# Altium footprint library 二极管封装库.PcbLib: 222 footprints (part 10 of 14)
Each footprint in its own frame and in the unit in brackets; x right, y up, seen from the top. Pads: shape width x height; smd on the part's side, far side on the other; paste and mask are expansions set on the pad; w line width, h text height; cw(c..) or ccw(c..) is an arc to the next point about the centre after c.
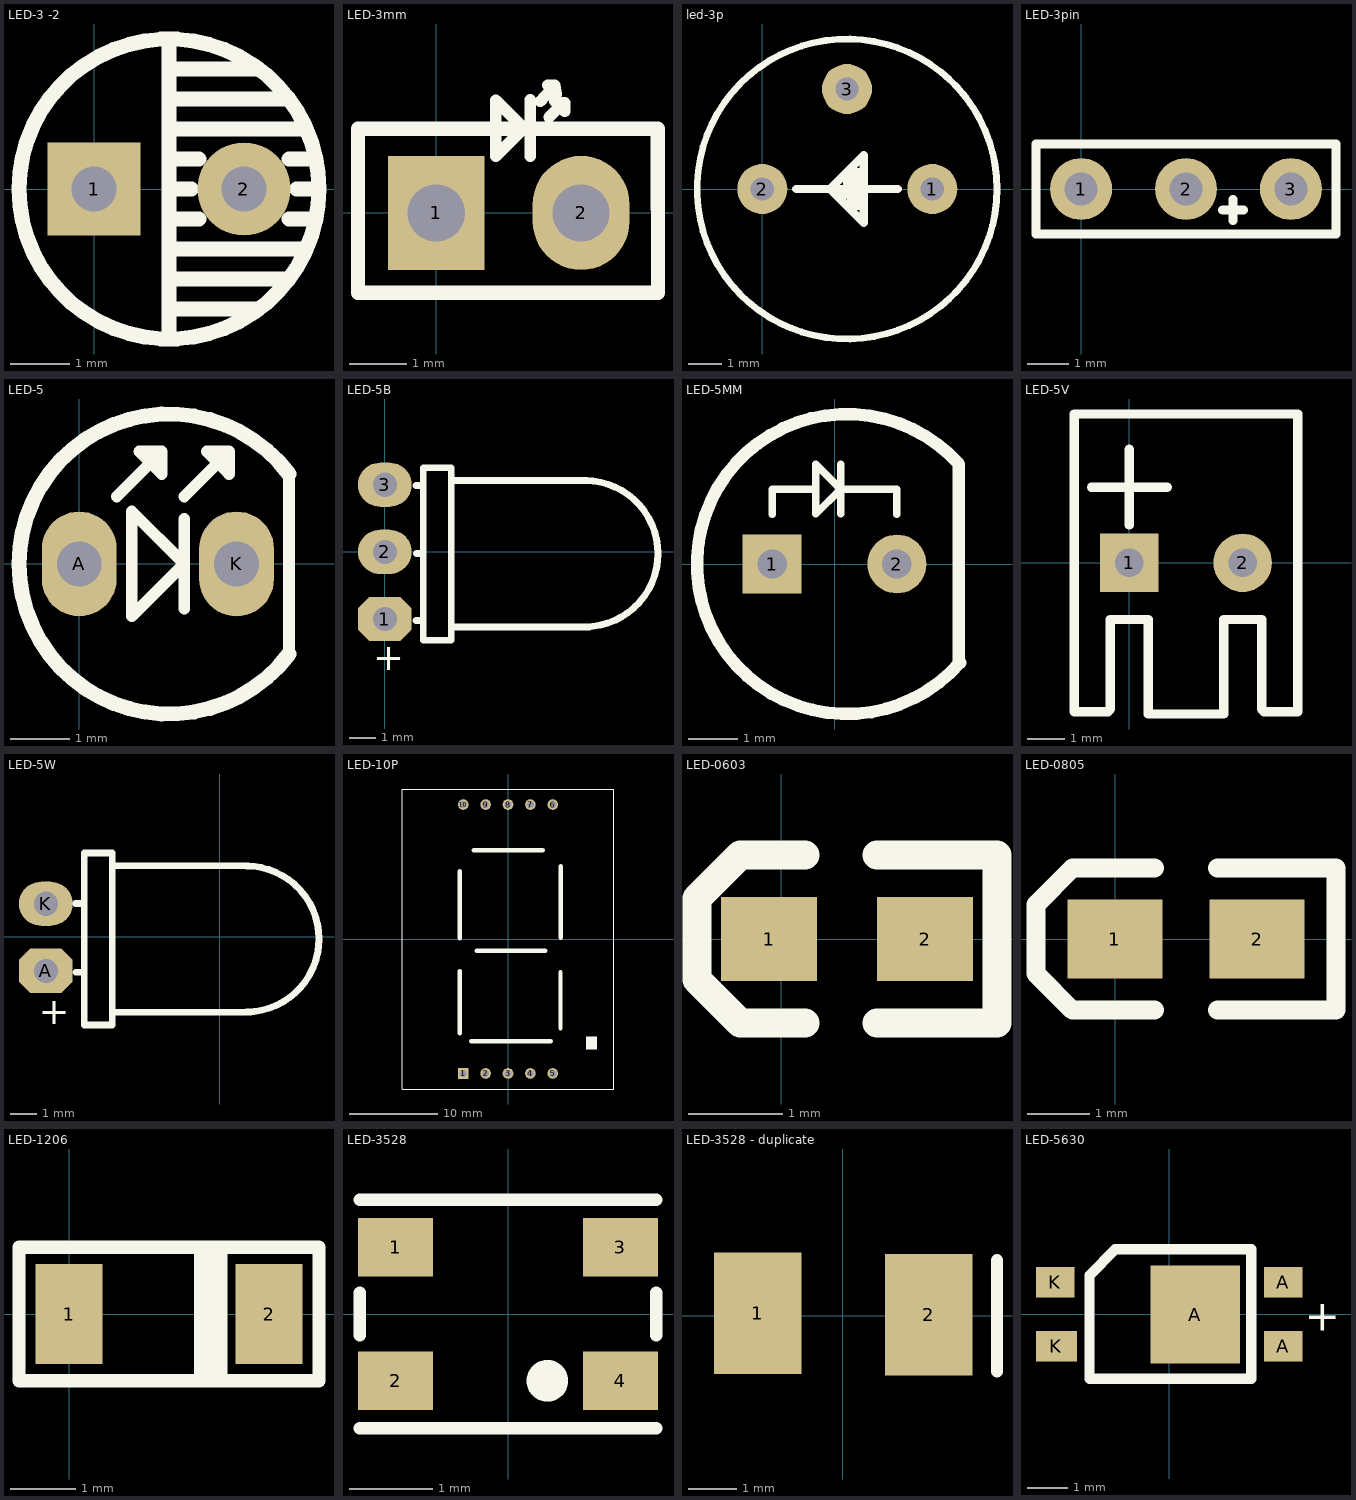
[diagram p9: the footprints below, top view; thin cyan lines are the x and y axes]

## LED-3 -2 [mil]
pads (2):
  rect 62x62 hole 30: 1(0,0)
  round 62 hole 30: 2(100,0)
Top Overlay:
  circle w10: c50,0 r100
  lines w10: 50,-100 50,100 ; 50,-80 110,-80 ; 50,-60 130,-60 ; 50,-40 140,-40 ; 50,-20 70,-20 ; 50,0 65,0 ; 50,20 70,20 ; 50,40 140,40 ; 50,60 130,60 ; 50,80 110,80 ; 130,-20 145,-20 ; 130,20 145,20 ; 135,0 150,0

## LED-3mm [mm]
pads (2):
  rect 1.7x2 hole 1: 1(0,0)
  oval 1.7x2 hole 1: 2(2.54,0)
Top Overlay:
  lines w0.2: 1.646,0.991 1.646,1.981 ; 1.824,1.955 2.078,2.234 ; 1.951,2.234 2.078,2.234 ; 1.976,1.675 2.23,1.929 2.078,1.955 ; 2.103,2.082 2.078,2.234 ; 2.256,1.777 2.256,1.929 ; 1.041,0.994 1.041,1.975 1.532,1.485 1.041,0.994
  lines w0.254: -1.372,-1.397 3.887,-1.397 3.884,1.473 -1.372,1.473 -1.372,-1.397
3D body "LED-RED3.STEP": height 5.38, standoff -3.17, extent -0.722,-2.019 3.262,1.473

## led-3p [mm]
pads (3):
  round 1.5 hole 0.7: 1(5.1,0) 2(0,0) 3(2.54,3)
Top Overlay:
  circle w0.2: c2.54,0 r4.5
  region: 3.048,0 2.54,0 2.54,-0.508 3.048,-0.508
  region: 3.048,0.508 2.54,0.508 2.54,0 3.048,0
  lines w0.254: 1.016,0 4.064,0 ; 2.339,-0.307 2.54,-0.106 2.54,0 ; 2.566,-0.508 3.048,-0.508 ; 3.048,0.508 2.54,0.508 ; 2.54,0 2.54,0.508 ; 2.54,0 2.54,0.508 ; 2.032,0 3.048,-1.016 3.048,1.016 2.032,0

## LED-3pin [mm]
pads (3):
  round 1.5 hole 0.8: 1(0,0) 2(2.54,0) 3(5.08,0)
Top Overlay:
  lines w0.22: 3.429,-0.508 3.937,-0.508 ; 3.683,-0.762 3.683,-0.254 ; -1.092,-1.092 -1.092,1.092 6.172,1.092 6.172,-1.092 -1.092,-1.092
3D body "User Library-L-115WEGW-CA.STEP": height 8.13, standoff -3.9, extent -0.25,-1.5 5.33,2

## LED-5 [mil]
pads (2):
  oval 50x70 hole 30: A(0,0) K(105,0)
Top Overlay:
  lines w7.78: 25,45 55,75 ; 70,-30 70,30 ; 70,45 100,75 ; 140,-60.15 140,60 ; 55,75 55,60 40,75 55,75 ; 100,75 100,60 85,75 100,75 ; 35,-35 35,35 70,0 35,-35
  lines w10: 140,-60.15 cw(c59.9,-0.07) 140,60

## LED-5B [mm]
pads (3):
  oct 2x1.651 hole 0.9 mask+0.03: 1(0,-2.502)
  oval 2x1.651 hole 0.9 mask+0.03: 2(0,0) 3(0,2.502)
Top Overlay:
  lines w0.254: 1.164,-2.551 1.393,-2.551 ; 1.164,2.478 1.393,2.478 ; 1.177,-0.062 1.406,-0.062 ; 2.472,-2.798 7.629,-2.798 ; 2.549,2.663 7.527,2.663 ; 7.477,-2.788 ccw(c7.454,-0.066) 7.476,2.656 ; 1.431,-3.294 2.472,-3.294 2.472,3.132 1.431,3.132 1.431,-3.294
  text "+" at -0.423,-4.405 h1
3D body "LED5-BW.STEP": height 0.87, standoff -7.2, extent -0.415,-3.115 11.108,2.884

## LED-5MM [mm]
pads (2):
  rect 1.2x1.2 hole 0.6: 1(-1.27,0)
  round 1.2 hole 0.6: 2(1.27,0)
Top Overlay:
  lines w0.15: -1.27,1.524 -0.381,1.524 ; 0.127,1.016 0.127,2.032 ; 1.27,1.524 0.508,1.524 0.127,1.524 ; -0.381,1.524 -0.381,1.016 0.127,1.524 ; -0.381,1.524 -0.381,2.032 0.127,1.524
  lines w0.152: -1.27,1.016 -1.27,1.524 ; 1.27,1.016 1.27,1.524
  lines w0.254: 2.53,-1.984 2.53,2.032 ccw(c0.254,0) 2.554,-2.005

## LED-5V [mil]
pads (2):
  rect 62x62 hole 30: 1(0,0)
  round 62 hole 30: 2(120,0)
Top Overlay:
  lines w10: -40,80 40,80 ; 0,40 0,120 ; -58.11,-157.48 -58.11,157.48 178.11,157.48 178.11,-157.48 142.52,-157.48 140,-154.96 140,-60 100,-60 100,-160 20,-160 20,-60 -20,-60 -20,-154.96 -22.52,-157.48 -58.11,-157.48

## LED-5W [mm]
pads (2):
  oct 2x1.651 hole 0.9 mask+0.03: A(-6.486,-1.271)
  oval 2x1.651 hole 0.9 mask+0.03: K(-6.486,1.23)
Top Overlay:
  lines w0.254: -5.385,1.245 -5.055,1.245 ; -5.359,-1.321 -5.105,-1.321 ; -4.013,-2.813 1.143,-2.813 ; -3.937,2.648 1.041,2.648 ; 0.991,-2.802 ccw(c0.969,-0.08) 0.991,2.642 ; -5.055,-3.283 -4.013,-3.283 -4.013,3.117 -5.055,3.117 -5.055,-3.283
  text "+" at -6.756,-3.251 h1
3D body "LED5-H.STEP": height 6, standoff -2.07, extent -6.849,-3.073 4.674,2.927

## LED-10P [mm]
pads (10):
  rect 1.2x1.2 hole 0.8: 1(-5.08,-15.24)
  round 1.2 hole 0.8: 2(-2.54,-15.24) 3(0,-15.24) 4(2.54,-15.24) 5(5.08,-15.24) 6(5.08,15.24) 7(2.54,15.24) 8(0,15.24) 9(-2.54,15.24) 10(-5.08,15.24)
Top Overlay:
  rectangle: 8.859,-12.496 10.072,-11.036
  lines w0.051: -12,-17 12,-17 12,17 -12,17 -12,-17
  lines w0.5: -5.471,-10.674 -5.471,-3.629 ; -5.471,0.101 -5.471,7.699 ; -4.181,-11.595 4.844,-11.595 ; -3.905,10.047 3.946,10.047 ; -3.537,-1.327 4.199,-1.327 ; 5.949,-10.122 5.949,-3.767 ; 5.989,0.137 5.995,8.251

## LED-0603 [mil]
pads (2):
  rect 40x35 smd: 1(-5,0) 2(60,0)
Top Overlay:
  lines w12: 10,-35 -17,-35 -35,-17 -35,17 -17,35 10,35 ; 40,-35 90,-35 90,35 40,35

## LED-0805 [mil]
pads (2):
  rect 60x50 smd: 1(-0.15,0.1) 2(89.85,0.1)
Top Overlay:
  lines w12: 24.85,-44.9 -27.11,-44.9 -50.15,-21.85 -50.15,21.85 -26.89,45.1 24.85,45.1 ; 64.85,-44.9 139.85,-44.9 139.85,45.1 64.85,45.1

## LED-1206 [mil]
pads (2):
  rect 40x60 smd: 1(0,0) 2(120,0)
Top Overlay:
  rectangle: 75,-40 95,40
  lines w8: -30,-40 -30,40 105,40 150,40 150,-40 105,-40 -30,-40

## LED-3528 [mm]
pads (4):
  rect 0.9x0.7 smd: 1(-1.35,0.8) 2(-1.35,-0.8) 3(1.35,0.8) 4(1.35,-0.8)
Top Overlay:
  circle w0.25: c0.472,-0.802 r0.125
  lines w0.152: -1.778,-1.372 1.778,-1.372 ; -1.778,-0.254 -1.778,0.254 ; -1.778,1.372 1.778,1.372 ; 1.778,-0.254 1.778,0.254
3D body "LED-3528.STEP": height 1.95, standoff 0, extent -1.747,-1.379 1.754,1.371

## LED-3528 - duplicate [mm] "贴片二极管"
height 3
pads (2):
  rect 1.8x2.5 smd: 1(-1.753,0.052) 2(1.772,0.027)
Top Overlay:
  lines w0.254: 3.175,-1.143 3.175,1.143

## LED-5630 [mm]
pads (5):
  rect 2.2x2.4 smd: A(0.635,-0.006)
  rect 0.95x0.75 smd: A(2.794,-0.781) A(2.794,0.781) K(-2.794,0.781)
  rect 1x0.75 smd: K(-2.769,-0.781)
Top Overlay:
  lines w0.254: -1.956,-1.581 2.007,-1.581 2.007,1.594 -1.321,1.594 -1.956,0.959 -1.956,-1.581
  text "+" at 3.327,-0.4 h0.76
3D body "User Library-5630.step": height 0.95, standoff -0.01, extent -2.775,-1.457 2.826,1.543